# Altium footprint library Chip_Packaging.PcbLib: 101 footprints (part 2 of 7)
Each footprint in its own frame and in the unit in brackets; x right, y up, seen from the top. Pads: shape width x height; smd on the part's side, far side on the other; paste and mask are expansions set on the pad; w line width, h text height; cw(c..) or ccw(c..) is an arc to the next point about the centre after c.
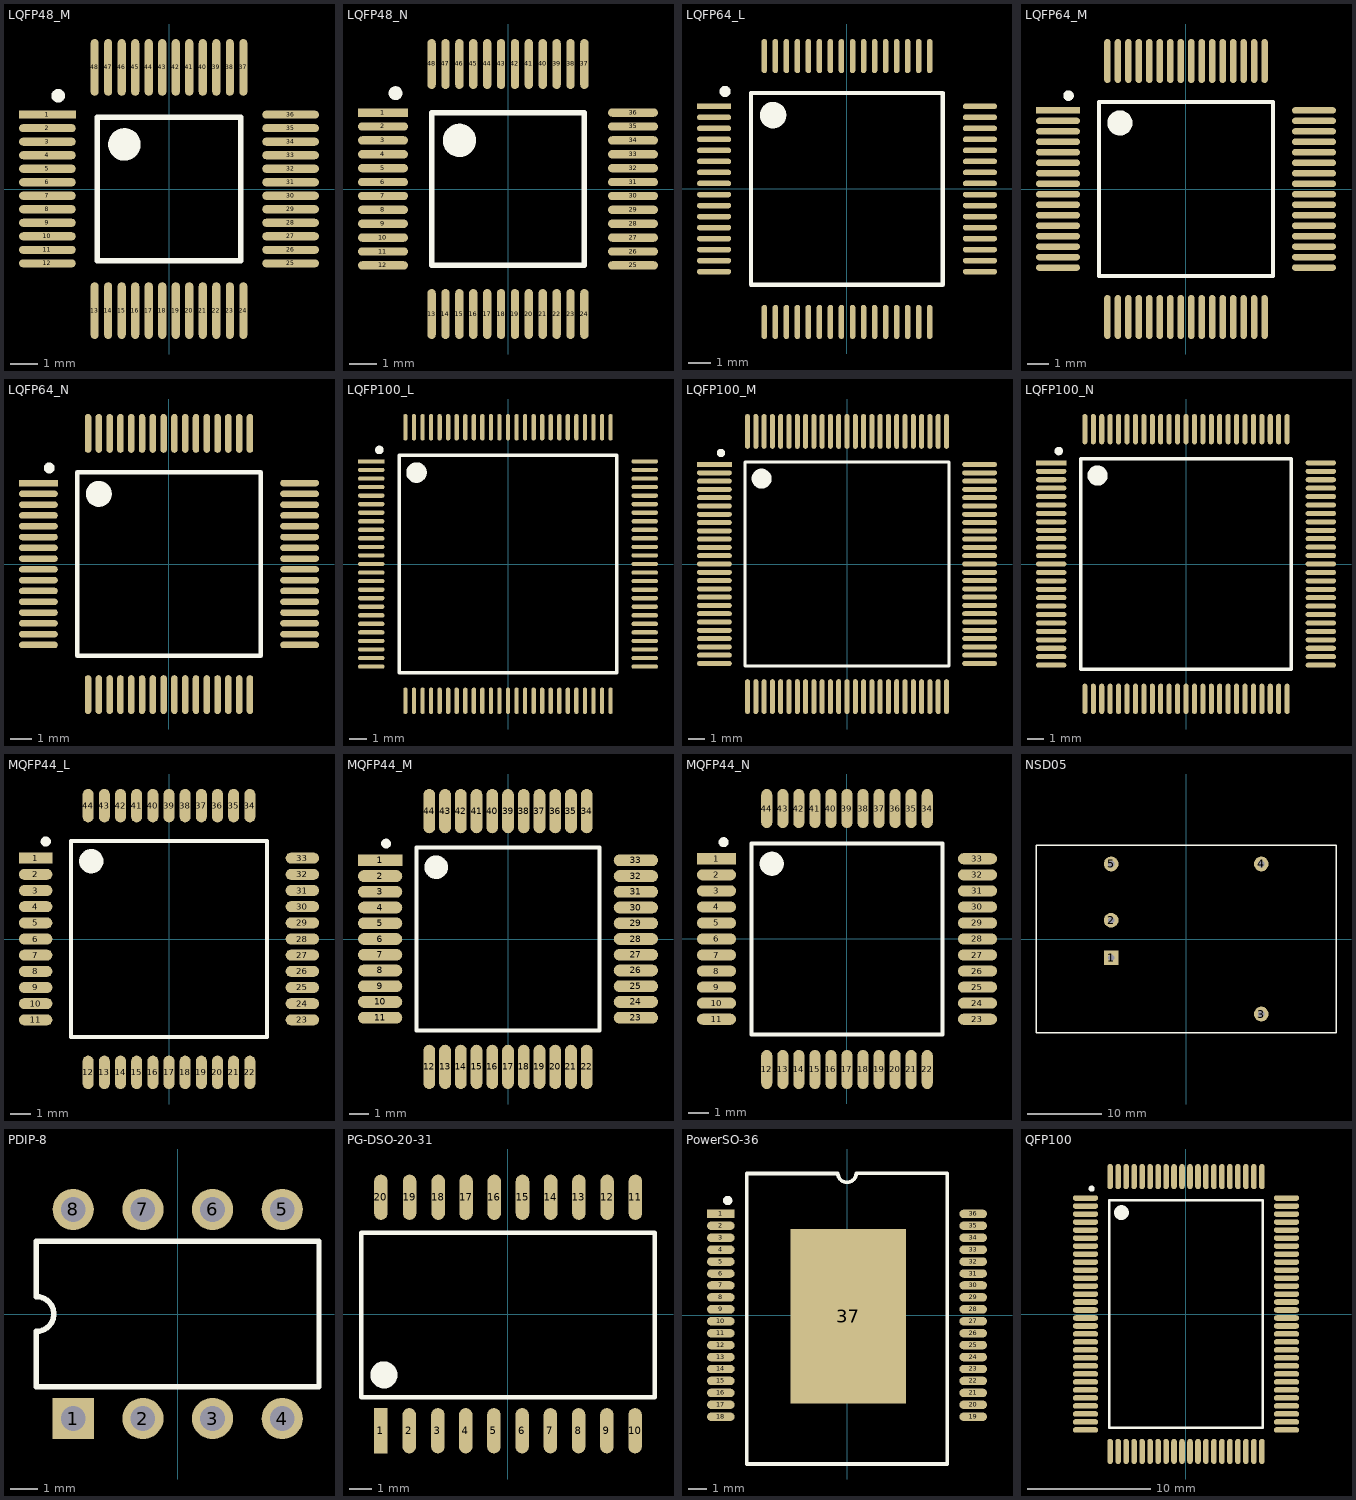
[diagram p1: the footprints below, top view; thin cyan lines are the x and y axes]

## LQFP48_M [mm] "Thin QFP, 48-Leads, Body 7x7mm, Pitch 0.5mm, IPC Low Density"
height 1.6
pads (48):
  rect 2.1x0.3 smd: 1(-4.5,2.75)
  oval 2.1x0.3 smd: 2(-4.5,2.25) 3(-4.5,1.75) 4(-4.5,1.25) 5(-4.5,0.75) 6(-4.5,0.25) 7(-4.5,-0.25) 8(-4.5,-0.75) 9(-4.5,-1.25) 10(-4.5,-1.75) 11(-4.5,-2.25) 12(-4.5,-2.75) 25(4.5,-2.75) 26(4.5,-2.25) 27(4.5,-1.75) 28(4.5,-1.25) 29(4.5,-0.75) 30(4.5,-0.25) 31(4.5,0.25) 32(4.5,0.75) 33(4.5,1.25) 34(4.5,1.75) 35(4.5,2.25) 36(4.5,2.75)
  oval 0.3x2.1 smd: 13(-2.75,-4.5) 14(-2.25,-4.5) 15(-1.75,-4.5) 16(-1.25,-4.5) 17(-0.75,-4.5) 18(-0.25,-4.5) 19(0.25,-4.5) 20(0.75,-4.5) 21(1.25,-4.5) 22(1.75,-4.5) 23(2.25,-4.5) 24(2.75,-4.5) 37(2.75,4.5) 38(2.25,4.5) 39(1.75,4.5) 40(1.25,4.5) 41(0.75,4.5) 42(0.25,4.5) 43(-0.25,4.5) 44(-0.75,4.5) 45(-1.25,4.5) 46(-1.75,4.5) 47(-2.25,4.5) 48(-2.75,4.5)
Top Overlay:
  circle w0.6: c-1.65,1.65 r0.3
  circle w0.25: c-4.1,3.45 r0.125
  lines w0.2: -2.65,-2.65 2.65,-2.65 2.65,2.65 -2.65,2.65 -2.65,-2.65
3D body "LQFP48.STEP": height 1.6, standoff 0, extent -4.5,-4.5 4.5,4.5

## LQFP48_N [mm] "Thin QFP, 48-Leads, Body 7x7mm, Pitch 0.5mm, IPC Medium Density"
height 1.6
pads (48):
  rect 1.8x0.3 smd: 1(-4.5,2.75)
  oval 1.8x0.3 smd: 2(-4.5,2.25) 3(-4.5,1.75) 4(-4.5,1.25) 5(-4.5,0.75) 6(-4.5,0.25) 7(-4.5,-0.25) 8(-4.5,-0.75) 9(-4.5,-1.25) 10(-4.5,-1.75) 11(-4.5,-2.25) 12(-4.5,-2.75) 25(4.5,-2.75) 26(4.5,-2.25) 27(4.5,-1.75) 28(4.5,-1.25) 29(4.5,-0.75) 30(4.5,-0.25) 31(4.5,0.25) 32(4.5,0.75) 33(4.5,1.25) 34(4.5,1.75) 35(4.5,2.25) 36(4.5,2.75)
  oval 0.3x1.8 smd: 13(-2.75,-4.5) 14(-2.25,-4.5) 15(-1.75,-4.5) 16(-1.25,-4.5) 17(-0.75,-4.5) 18(-0.25,-4.5) 19(0.25,-4.5) 20(0.75,-4.5) 21(1.25,-4.5) 22(1.75,-4.5) 23(2.25,-4.5) 24(2.75,-4.5) 37(2.75,4.5) 38(2.25,4.5) 39(1.75,4.5) 40(1.25,4.5) 41(0.75,4.5) 42(0.25,4.5) 43(-0.25,4.5) 44(-0.75,4.5) 45(-1.25,4.5) 46(-1.75,4.5) 47(-2.25,4.5) 48(-2.75,4.5)
Top Overlay:
  circle w0.25: c-4.05,3.45 r0.125
  circle w0.6: c-1.75,1.75 r0.3
  lines w0.2: -2.75,-2.75 -2.75,2.75 2.75,2.75 2.75,-2.75 -2.75,-2.75
3D body "LQFP48.STEP": height 1.6, standoff 0, extent -4.5,-4.5 4.5,4.5

## LQFP64_L [mm] "Thin QFP, 64-Leads, Body 10x10mm, Pitch 0.5mm, IPC High Density"
height 1.6
pads (64):
  rect 1.55x0.25 smd: 1(-6.025,3.75)
  oval 1.55x0.25 smd: 2(-6.025,3.25) 3(-6.025,2.75) 4(-6.025,2.25) 5(-6.025,1.75) 6(-6.025,1.25) 7(-6.025,0.75) 8(-6.025,0.25) 9(-6.025,-0.25) 10(-6.025,-0.75) 11(-6.025,-1.25) 12(-6.025,-1.75) 13(-6.025,-2.25) 14(-6.025,-2.75) 15(-6.025,-3.25) 16(-6.025,-3.75) 33(6.025,-3.75) 34(6.025,-3.25) 35(6.025,-2.75) 36(6.025,-2.25) 37(6.025,-1.75) 38(6.025,-1.25) 39(6.025,-0.75) 40(6.025,-0.25) 41(6.025,0.25) 42(6.025,0.75) 43(6.025,1.25) 44(6.025,1.75) 45(6.025,2.25) 46(6.025,2.75) 47(6.025,3.25) 48(6.025,3.75)
  oval 0.25x1.55 smd: 17(-3.75,-6.025) 18(-3.25,-6.025) 19(-2.75,-6.025) 20(-2.25,-6.025) 21(-1.75,-6.025) 22(-1.25,-6.025) 23(-0.75,-6.025) 24(-0.25,-6.025) 25(0.25,-6.025) 26(0.75,-6.025) 27(1.25,-6.025) 28(1.75,-6.025) 29(2.25,-6.025) 30(2.75,-6.025) 31(3.25,-6.025) 32(3.75,-6.025) 49(3.75,6.025) 50(3.25,6.025) 51(2.75,6.025) 52(2.25,6.025) 53(1.75,6.025) 54(1.25,6.025) 55(0.75,6.025) 56(0.25,6.025) 57(-0.25,6.025) 58(-0.75,6.025) 59(-1.25,6.025) 60(-1.75,6.025) 61(-2.25,6.025) 62(-2.75,6.025) 63(-3.25,6.025) 64(-3.75,6.025)
Top Overlay:
  circle w0.25: c-5.525,4.425 r0.125
  circle w0.6: c-3.35,3.35 r0.3
  lines w0.2: -4.35,-4.35 -4.35,4.35 4.35,4.35 4.35,-4.35 -4.35,-4.35
3D body "LQFP64.STEP": height 1.7, standoff -0.01, extent -6,-6 6,6

## LQFP64_M [mm] "Thin QFP, 64-Leads, Body 10x10mm, Pitch 0.5mm, IPC Low Density"
height 1.6
pads (64):
  rect 2.1x0.3 smd: 1(-6.1,3.75)
  oval 2.1x0.3 smd: 2(-6.1,3.25) 3(-6.1,2.75) 4(-6.1,2.25) 5(-6.1,1.75) 6(-6.1,1.25) 7(-6.1,0.75) 8(-6.1,0.25) 9(-6.1,-0.25) 10(-6.1,-0.75) 11(-6.1,-1.25) 12(-6.1,-1.75) 13(-6.1,-2.25) 14(-6.1,-2.75) 15(-6.1,-3.25) 16(-6.1,-3.75) 33(6.1,-3.75) 34(6.1,-3.25) 35(6.1,-2.75) 36(6.1,-2.25) 37(6.1,-1.75) 38(6.1,-1.25) 39(6.1,-0.75) 40(6.1,-0.25) 41(6.1,0.25) 42(6.1,0.75) 43(6.1,1.25) 44(6.1,1.75) 45(6.1,2.25) 46(6.1,2.75) 47(6.1,3.25) 48(6.1,3.75)
  oval 0.3x2.1 smd: 17(-3.75,-6.1) 18(-3.25,-6.1) 19(-2.75,-6.1) 20(-2.25,-6.1) 21(-1.75,-6.1) 22(-1.25,-6.1) 23(-0.75,-6.1) 24(-0.25,-6.1) 25(0.25,-6.1) 26(0.75,-6.1) 27(1.25,-6.1) 28(1.75,-6.1) 29(2.25,-6.1) 30(2.75,-6.1) 31(3.25,-6.1) 32(3.75,-6.1) 49(3.75,6.1) 50(3.25,6.1) 51(2.75,6.1) 52(2.25,6.1) 53(1.75,6.1) 54(1.25,6.1) 55(0.75,6.1) 56(0.25,6.1) 57(-0.25,6.1) 58(-0.75,6.1) 59(-1.25,6.1) 60(-1.75,6.1) 61(-2.25,6.1) 62(-2.75,6.1) 63(-3.25,6.1) 64(-3.75,6.1)
Top Overlay:
  circle w0.25: c-5.6,4.45 r0.125
  circle w0.6: c-3.15,3.15 r0.3
  lines w0.2: -4.15,-4.15 -4.15,4.15 4.15,4.15 4.15,-4.15 -4.15,-4.15
3D body "LQFP64.STEP": height 1.7, standoff -0.01, extent -6,-6 6,6

## LQFP64_N [mm] "Thin QFP, 64-Leads, Body 10x10mm, Pitch 0.5mm, IPC Medium Density"
height 1.6
pads (64):
  rect 1.8x0.3 smd: 1(-6.05,3.75)
  oval 1.8x0.3 smd: 2(-6.05,3.25) 3(-6.05,2.75) 4(-6.05,2.25) 5(-6.05,1.75) 6(-6.05,1.25) 7(-6.05,0.75) 8(-6.05,0.25) 9(-6.05,-0.25) 10(-6.05,-0.75) 11(-6.05,-1.25) 12(-6.05,-1.75) 13(-6.05,-2.25) 14(-6.05,-2.75) 15(-6.05,-3.25) 16(-6.05,-3.75) 33(6.05,-3.75) 34(6.05,-3.25) 35(6.05,-2.75) 36(6.05,-2.25) 37(6.05,-1.75) 38(6.05,-1.25) 39(6.05,-0.75) 40(6.05,-0.25) 41(6.05,0.25) 42(6.05,0.75) 43(6.05,1.25) 44(6.05,1.75) 45(6.05,2.25) 46(6.05,2.75) 47(6.05,3.25) 48(6.05,3.75)
  oval 0.3x1.8 smd: 17(-3.75,-6.05) 18(-3.25,-6.05) 19(-2.75,-6.05) 20(-2.25,-6.05) 21(-1.75,-6.05) 22(-1.25,-6.05) 23(-0.75,-6.05) 24(-0.25,-6.05) 25(0.25,-6.05) 26(0.75,-6.05) 27(1.25,-6.05) 28(1.75,-6.05) 29(2.25,-6.05) 30(2.75,-6.05) 31(3.25,-6.05) 32(3.75,-6.05) 49(3.75,6.05) 50(3.25,6.05) 51(2.75,6.05) 52(2.25,6.05) 53(1.75,6.05) 54(1.25,6.05) 55(0.75,6.05) 56(0.25,6.05) 57(-0.25,6.05) 58(-0.75,6.05) 59(-1.25,6.05) 60(-1.75,6.05) 61(-2.25,6.05) 62(-2.75,6.05) 63(-3.25,6.05) 64(-3.75,6.05)
Top Overlay:
  circle w0.25: c-5.55,4.45 r0.125
  circle w0.6: c-3.25,3.25 r0.3
  lines w0.2: -4.25,-4.25 -4.25,4.25 4.25,4.25 4.25,-4.25 -4.25,-4.25
3D body "LQFP64.STEP": height 1.7, standoff -0.01, extent -6,-6 6,6

## LQFP100_L [mm] "Thin QFP, 100-Leads, Body 14x14mm, Pitch 0.5mm, IPC High Density"
height 1.6
pads (100):
  rect 1.55x0.25 smd: 1(-8,6)
  oval 1.55x0.25 smd: 2(-8,5.5) 3(-8,5) 4(-8,4.5) 5(-8,4) 6(-8,3.5) 7(-8,3) 8(-8,2.5) 9(-8,2) 10(-8,1.5) 11(-8,1) 12(-8,0.5) 13(-8,0) 14(-8,-0.5) 15(-8,-1) 16(-8,-1.5) 17(-8,-2) 18(-8,-2.5) 19(-8,-3) 20(-8,-3.5) 21(-8,-4) 22(-8,-4.5) 23(-8,-5) 24(-8,-5.5) 25(-8,-6) 51(8,-6) 52(8,-5.5) 53(8,-5) 54(8,-4.5) 55(8,-4) 56(8,-3.5) 57(8,-3) 58(8,-2.5) 59(8,-2) 60(8,-1.5) 61(8,-1) 62(8,-0.5) 63(8,0) 64(8,0.5) 65(8,1) 66(8,1.5) 67(8,2) 68(8,2.5) 69(8,3) 70(8,3.5) 71(8,4) 72(8,4.5) 73(8,5) 74(8,5.5) 75(8,6)
  oval 0.25x1.55 smd: 26(-6,-8) 27(-5.5,-8) 28(-5,-8) 29(-4.5,-8) 30(-4,-8) 31(-3.5,-8) 32(-3,-8) 33(-2.5,-8) 34(-2,-8) 35(-1.5,-8) 36(-1,-8) 37(-0.5,-8) 38(0,-8) 39(0.5,-8) 40(1,-8) 41(1.5,-8) 42(2,-8) 43(2.5,-8) 44(3,-8) 45(3.5,-8) 46(4,-8) 47(4.5,-8) 48(5,-8) 49(5.5,-8) 50(6,-8) 76(6,8) 77(5.5,8) 78(5,8) 79(4.5,8) 80(4,8) 81(3.5,8) 82(3,8) 83(2.5,8) 84(2,8) 85(1.5,8) 86(1,8) 87(0.5,8) 88(0,8) 89(-0.5,8) 90(-1,8) 91(-1.5,8) 92(-2,8) 93(-2.5,8) 94(-3,8) 95(-3.5,8) 96(-4,8) 97(-4.5,8) 98(-5,8) 99(-5.5,8) 100(-6,8)
Top Overlay:
  circle w0.6: c-5.35,5.35 r0.3
  circle w0.25: c-7.525,6.675 r0.125
  lines w0.2: -6.35,-6.35 6.35,-6.35 6.35,6.35 -6.35,6.35 -6.35,-6.35
3D body "LQFP100.STEP": height 1.6, standoff 0, extent -8,-8 8,8

## LQFP100_M [mm] "Thin QFP, 100-Leads, Body 14x14mm, Pitch 0.5mm, IPC Low Density"
height 1.6
pads (100):
  rect 2.1x0.3 smd: 1(-8,6)
  oval 2.1x0.3 smd: 2(-8,5.5) 3(-8,5) 4(-8,4.5) 5(-8,4) 6(-8,3.5) 7(-8,3) 8(-8,2.5) 9(-8,2) 10(-8,1.5) 11(-8,1) 12(-8,0.5) 13(-8,0) 14(-8,-0.5) 15(-8,-1) 16(-8,-1.5) 17(-8,-2) 18(-8,-2.5) 19(-8,-3) 20(-8,-3.5) 21(-8,-4) 22(-8,-4.5) 23(-8,-5) 24(-8,-5.5) 25(-8,-6) 51(8,-6) 52(8,-5.5) 53(8,-5) 54(8,-4.5) 55(8,-4) 56(8,-3.5) 57(8,-3) 58(8,-2.5) 59(8,-2) 60(8,-1.5) 61(8,-1) 62(8,-0.5) 63(8,0) 64(8,0.5) 65(8,1) 66(8,1.5) 67(8,2) 68(8,2.5) 69(8,3) 70(8,3.5) 71(8,4) 72(8,4.5) 73(8,5) 74(8,5.5) 75(8,6)
  oval 0.3x2.1 smd: 26(-6,-8) 27(-5.5,-8) 28(-5,-8) 29(-4.5,-8) 30(-4,-8) 31(-3.5,-8) 32(-3,-8) 33(-2.5,-8) 34(-2,-8) 35(-1.5,-8) 36(-1,-8) 37(-0.5,-8) 38(0,-8) 39(0.5,-8) 40(1,-8) 41(1.5,-8) 42(2,-8) 43(2.5,-8) 44(3,-8) 45(3.5,-8) 46(4,-8) 47(4.5,-8) 48(5,-8) 49(5.5,-8) 50(6,-8) 76(6,8) 77(5.5,8) 78(5,8) 79(4.5,8) 80(4,8) 81(3.5,8) 82(3,8) 83(2.5,8) 84(2,8) 85(1.5,8) 86(1,8) 87(0.5,8) 88(0,8) 89(-0.5,8) 90(-1,8) 91(-1.5,8) 92(-2,8) 93(-2.5,8) 94(-3,8) 95(-3.5,8) 96(-4,8) 97(-4.5,8) 98(-5,8) 99(-5.5,8) 100(-6,8)
Top Overlay:
  circle w0.6: c-5.15,5.15 r0.3
  circle w0.25: c-7.6,6.7 r0.125
  lines w0.2: -6.15,-6.15 6.15,-6.15 6.15,6.15 -6.15,6.15 -6.15,-6.15
3D body "LQFP100.STEP": height 1.6, standoff 0, extent -8,-8 8,8

## LQFP100_N [mm] "Thin QFP, 100-Leads, Body 14x14mm, Pitch 0.5mm, IPC Medium Density"
height 1.6
pads (100):
  rect 1.8x0.3 smd: 1(-8,6)
  oval 1.8x0.3 smd: 2(-8,5.5) 3(-8,5) 4(-8,4.5) 5(-8,4) 6(-8,3.5) 7(-8,3) 8(-8,2.5) 9(-8,2) 10(-8,1.5) 11(-8,1) 12(-8,0.5) 13(-8,0) 14(-8,-0.5) 15(-8,-1) 16(-8,-1.5) 17(-8,-2) 18(-8,-2.5) 19(-8,-3) 20(-8,-3.5) 21(-8,-4) 22(-8,-4.5) 23(-8,-5) 24(-8,-5.5) 25(-8,-6) 51(8,-6) 52(8,-5.5) 53(8,-5) 54(8,-4.5) 55(8,-4) 56(8,-3.5) 57(8,-3) 58(8,-2.5) 59(8,-2) 60(8,-1.5) 61(8,-1) 62(8,-0.5) 63(8,0) 64(8,0.5) 65(8,1) 66(8,1.5) 67(8,2) 68(8,2.5) 69(8,3) 70(8,3.5) 71(8,4) 72(8,4.5) 73(8,5) 74(8,5.5) 75(8,6)
  oval 0.3x1.8 smd: 26(-6,-8) 27(-5.5,-8) 28(-5,-8) 29(-4.5,-8) 30(-4,-8) 31(-3.5,-8) 32(-3,-8) 33(-2.5,-8) 34(-2,-8) 35(-1.5,-8) 36(-1,-8) 37(-0.5,-8) 38(0,-8) 39(0.5,-8) 40(1,-8) 41(1.5,-8) 42(2,-8) 43(2.5,-8) 44(3,-8) 45(3.5,-8) 46(4,-8) 47(4.5,-8) 48(5,-8) 49(5.5,-8) 50(6,-8) 76(6,8) 77(5.5,8) 78(5,8) 79(4.5,8) 80(4,8) 81(3.5,8) 82(3,8) 83(2.5,8) 84(2,8) 85(1.5,8) 86(1,8) 87(0.5,8) 88(0,8) 89(-0.5,8) 90(-1,8) 91(-1.5,8) 92(-2,8) 93(-2.5,8) 94(-3,8) 95(-3.5,8) 96(-4,8) 97(-4.5,8) 98(-5,8) 99(-5.5,8) 100(-6,8)
Top Overlay:
  circle w0.25: c-7.55,6.7 r0.125
  circle w0.6: c-5.25,5.25 r0.3
  lines w0.2: -6.25,-6.25 -6.25,6.25 6.25,6.25 6.25,-6.25 -6.25,-6.25
3D body "LQFP100.STEP": height 1.6, standoff 0, extent -8,-8 8,8

## MQFP44_L [mm] "QFP, 44-Leads, Body 10x10mm, Pitch 0.8mm, IPC High Density"
height 2.39
pads (44):
  rect 1.65x0.55 smd: 1(-6.6,4)
  oval 1.65x0.55 smd: 2(-6.6,3.2) 3(-6.6,2.4) 4(-6.6,1.6) 5(-6.6,0.8) 6(-6.6,0) 7(-6.6,-0.8) 8(-6.6,-1.6) 9(-6.6,-2.4) 10(-6.6,-3.2) 11(-6.6,-4) 23(6.6,-4) 24(6.6,-3.2) 25(6.6,-2.4) 26(6.6,-1.6) 27(6.6,-0.8) 28(6.6,0) 29(6.6,0.8) 30(6.6,1.6) 31(6.6,2.4) 32(6.6,3.2) 33(6.6,4)
  oval 0.55x1.65 smd: 12(-4,-6.6) 13(-3.2,-6.6) 14(-2.4,-6.6) 15(-1.6,-6.6) 16(-0.8,-6.6) 17(0,-6.6) 18(0.8,-6.6) 19(1.6,-6.6) 20(2.4,-6.6) 21(3.2,-6.6) 22(4,-6.6) 34(4,6.6) 35(3.2,6.6) 36(2.4,6.6) 37(1.6,6.6) 38(0.8,6.6) 39(0,6.6) 40(-0.8,6.6) 41(-1.6,6.6) 42(-2.4,6.6) 43(-3.2,6.6) 44(-4,6.6)
Top Overlay:
  circle w0.25: c-6.1,4.825 r0.125
  circle w0.6: c-3.85,3.85 r0.3
  lines w0.2: -4.85,-4.85 -4.85,4.85 4.85,4.85 4.85,-4.85 -4.85,-4.85
3D body "MQFP44.STEP": height 2.25, standoff 0, extent -6.6,-6.6 6.6,6.6

## MQFP44_M [mm] "QFP, 44-Leads, Body 10x10mm, Pitch 0.8mm, IPC Low Density"
height 2.39
pads (44):
  rect 2.25x0.6 smd: 1(-6.5,4)
  oval 2.25x0.6 smd: 2(-6.5,3.2) 3(-6.5,2.4) 4(-6.5,1.6) 5(-6.5,0.8) 6(-6.5,0) 7(-6.5,-0.8) 8(-6.5,-1.6) 9(-6.5,-2.4) 10(-6.5,-3.2) 11(-6.5,-4) 23(6.5,-4) 24(6.5,-3.2) 25(6.5,-2.4) 26(6.5,-1.6) 27(6.5,-0.8) 28(6.5,0) 29(6.5,0.8) 30(6.5,1.6) 31(6.5,2.4) 32(6.5,3.2) 33(6.5,4)
  oval 0.6x2.25 smd: 12(-4,-6.5) 13(-3.2,-6.5) 14(-2.4,-6.5) 15(-1.6,-6.5) 16(-0.8,-6.5) 17(0,-6.5) 18(0.8,-6.5) 19(1.6,-6.5) 20(2.4,-6.5) 21(3.2,-6.5) 22(4,-6.5) 34(4,6.5) 35(3.2,6.5) 36(2.4,6.5) 37(1.6,6.5) 38(0.8,6.5) 39(0,6.5) 40(-0.8,6.5) 41(-1.6,6.5) 42(-2.4,6.5) 43(-3.2,6.5) 44(-4,6.5)
Top Overlay:
  circle w0.25: c-6.2,4.85 r0.125
  circle w0.6: c-3.65,3.65 r0.3
  lines w0.2: -4.65,-4.65 -4.65,4.65 4.65,4.65 4.65,-4.65 -4.65,-4.65
3D body "MQFP44.STEP": height 2.25, standoff 0, extent -6.6,-6.6 6.6,6.6

## MQFP44_N [mm] "QFP, 44-Leads, Body 10x10mm, Pitch 0.8mm, IPC Medium Density"
height 2.39
pads (44):
  rect 1.95x0.55 smd: 1(-6.5,4)
  oval 1.95x0.55 smd: 2(-6.5,3.2) 3(-6.5,2.4) 4(-6.5,1.6) 5(-6.5,0.8) 6(-6.5,0) 7(-6.5,-0.8) 8(-6.5,-1.6) 9(-6.5,-2.4) 10(-6.5,-3.2) 11(-6.5,-4) 23(6.5,-4) 24(6.5,-3.2) 25(6.5,-2.4) 26(6.5,-1.6) 27(6.5,-0.8) 28(6.5,0) 29(6.5,0.8) 30(6.5,1.6) 31(6.5,2.4) 32(6.5,3.2) 33(6.5,4)
  oval 0.55x1.95 smd: 12(-4,-6.5) 13(-3.2,-6.5) 14(-2.4,-6.5) 15(-1.6,-6.5) 16(-0.8,-6.5) 17(0,-6.5) 18(0.8,-6.5) 19(1.6,-6.5) 20(2.4,-6.5) 21(3.2,-6.5) 22(4,-6.5) 34(4,6.5) 35(3.2,6.5) 36(2.4,6.5) 37(1.6,6.5) 38(0.8,6.5) 39(0,6.5) 40(-0.8,6.5) 41(-1.6,6.5) 42(-2.4,6.5) 43(-3.2,6.5) 44(-4,6.5)
Top Overlay:
  circle w0.6: c-3.75,3.75 r0.3
  circle w0.25: c-6.15,4.825 r0.125
  lines w0.2: -4.75,-4.75 4.75,-4.75 4.75,4.75 -4.75,4.75 -4.75,-4.75
3D body "MQFP44.STEP": height 2.25, standoff 0, extent -6.6,-6.6 6.6,6.6

## NSD05 [mm] "5W DC-DC Regulated Single Output"
height 8.3
pads (5):
  rect 2x2 hole 0.9: 1(-10.16,-2.54)
  round 2 hole 0.9: 2(-10.16,2.54) 3(10.16,-10.16) 4(10.16,10.16) 5(-10.16,10.16)
Top Overlay:
  lines w0.2: -19.33,-12.7 -18.33,-12.7 ; -20.33,-12.7 -20.33,12.7 20.27,12.7 20.27,-12.7 -20.33,-12.7
3D body: height 8.3, standoff 2.3, extent -17.5,-11 17.5,11
3D body: height 2.3, standoff 1.5, extent -20.325,-12.7 20.275,12.675
3D body: height 0, standoff -3, extent 9.84,9.84 10.48,10.48
3D body: height 1.5, standoff 0, extent 9.52,9.52 10.8,10.8
3D body: height 0, standoff -3, extent 9.84,-10.48 10.48,-9.84
3D body: height 1.5, standoff 0, extent 9.52,-10.8 10.8,-9.52
3D body: height 0, standoff -3, extent -10.48,-2.86 -9.84,-2.22
3D body: height 1.5, standoff 0, extent -10.8,-3.18 -9.52,-1.9
3D body: height 0, standoff -3, extent -10.48,2.22 -9.84,2.86
3D body: height 1.5, standoff 0, extent -10.8,1.9 -9.52,3.18
3D body: height 1.5, standoff 0, extent -10.8,9.52 -9.52,10.8
3D body: height 0, standoff -3, extent -10.48,9.84 -9.84,10.48

## PDIP-8 [mm] "DIP; 8 Leads; Row Spacing 7.62 mm; Pitch 2.54 mm"
height 4.45
pads (8):
  rect 1.5x1.5 hole 0.9: 1(-3.81,-3.81)
  round 1.5 hole 0.9: 2(-1.27,-3.81) 3(1.27,-3.81) 4(3.81,-3.81) 5(3.81,3.81) 6(1.27,3.81) 7(-1.27,3.81) 8(-3.81,3.81)
Top Overlay:
  lines w0.2: -5.15,-2.65 -5.15,-0.635 ccw(c-5.15,0) -5.15,0.635 -5.15,2.65 5.15,2.65 5.15,-2.65 -5.15,-2.65
3D body "DIP-8.STEP": height 4.57, standoff -3.81, extent -4.955,-3.91 4.955,3.91

## PG-DSO-20-31 [mm]
height 2.65
pads (20):
  rect 0.6x2 smd: 1(-5.642,-5.17)
  oval 0.6x2 smd: 2(-4.372,-5.17) 3(-3.102,-5.17) 4(-1.872,-5.17) 5(-0.622,-5.17) 6(0.628,-5.17) 7(1.878,-5.17) 8(3.128,-5.17) 9(4.378,-5.17) 10(5.628,-5.17) 11(5.643,5.17) 12(4.393,5.17) 13(3.143,5.17) 14(1.893,5.17) 15(0.643,5.17) 16(-0.607,5.17) 17(-1.857,5.17) 18(-3.087,5.17) 19(-4.357,5.17) 20(-5.627,5.17)
Top Overlay:
  circle w0.6: c-5.492,-2.695 r0.3
  lines w0.2: -6.492,-3.695 6.508,-3.695 6.508,3.6 -6.492,3.6 -6.492,-3.695
3D body "SOIC-20.STEP": height 2.66, standoff 0, extent -6.5,-5.315 6.5,5.315

## PowerSO-36 [mm]
pads (37):
  rect 1.5x0.46 smd: 1(-6.875,5.525)
  oval 1.5x0.46 smd: 2(-6.875,4.875) 3(-6.875,4.225) 4(-6.875,3.575) 5(-6.875,2.925) 6(-6.875,2.275) 7(-6.875,1.625) 8(-6.875,0.975) 9(-6.875,0.325) 10(-6.875,-0.325) 11(-6.875,-0.975) 12(-6.875,-1.625) 13(-6.875,-2.275) 14(-6.875,-2.925) 15(-6.875,-3.575) 16(-6.875,-4.225) 17(-6.875,-4.875) 18(-6.875,-5.525) 19(6.875,-5.525) 20(6.875,-4.875) 21(6.875,-4.225) 22(6.875,-3.575) 23(6.875,-2.925) 24(6.875,-2.275) 25(6.875,-1.625) 26(6.875,-0.975) 27(6.875,-0.325) 28(6.875,0.325) 29(6.875,0.975) 30(6.875,1.625) 31(6.875,2.275) 32(6.875,2.925) 33(6.875,3.575) 34(6.875,4.225) 35(6.875,4.875) 36(6.875,5.525)
  rect 6.3x9.5 smd: 37(0.075,-0.06)
Top Overlay:
  circle w0.3: c-6.5,6.25 r0.1
  lines w0.2: -0.5,7.725 -5.465,7.725 -5.465,-8.1 5.465,-8.1 5.465,7.732 0.5,7.732 cw(c0,7.741) -0.5,7.725
3D body "SO-36.STEP": height 3.6, standoff 0.1, extent -7.1,-8.125 7.1,7.825

## QFP100 [mm] "QFP, 100-Leads, Body 20x14mm, Pitch 0.65mm, IPC Low Density"
height 1.6
pads (100):
  oval 2.05x0.45 smd: 1(-8.175,9.425) 2(-8.175,8.775) 3(-8.175,8.125) 4(-8.175,7.475) 5(-8.175,6.825) 6(-8.175,6.175) 7(-8.175,5.525) 8(-8.175,4.875) 9(-8.175,4.225) 10(-8.175,3.575) 11(-8.175,2.925) 12(-8.175,2.275) 13(-8.175,1.625) 14(-8.175,0.975) 15(-8.175,0.325) 16(-8.175,-0.325) 17(-8.175,-0.975) 18(-8.175,-1.625) 19(-8.175,-2.275) 20(-8.175,-2.925) 21(-8.175,-3.575) 22(-8.175,-4.225) 23(-8.175,-4.875) 24(-8.175,-5.525) 25(-8.175,-6.175) 26(-8.175,-6.825) 27(-8.175,-7.475) 28(-8.175,-8.125) 29(-8.175,-8.775) 30(-8.175,-9.425) 51(8.175,-9.425) 52(8.175,-8.775) 53(8.175,-8.125) 54(8.175,-7.475) 55(8.175,-6.825) 56(8.175,-6.175) 57(8.175,-5.525) 58(8.175,-4.875) 59(8.175,-4.225) 60(8.175,-3.575) 61(8.175,-2.925) 62(8.175,-2.275) 63(8.175,-1.625) 64(8.175,-0.975) 65(8.175,-0.325) 66(8.175,0.325) 67(8.175,0.975) 68(8.175,1.625) 69(8.175,2.275) 70(8.175,2.925) 71(8.175,3.575) 72(8.175,4.225) 73(8.175,4.875) 74(8.175,5.525) 75(8.175,6.175) 76(8.175,6.825) 77(8.175,7.475) 78(8.175,8.125) 79(8.175,8.775) 80(8.175,9.425)
  oval 0.45x2.05 smd: 31(-6.175,-11.175) 32(-5.525,-11.175) 33(-4.875,-11.175) 34(-4.225,-11.175) 35(-3.575,-11.175) 36(-2.925,-11.175) 37(-2.275,-11.175) 38(-1.625,-11.175) 39(-0.975,-11.175) 40(-0.325,-11.175) 41(0.325,-11.175) 42(0.975,-11.175) 43(1.625,-11.175) 44(2.275,-11.175) 45(2.925,-11.175) 46(3.575,-11.175) 47(4.225,-11.175) 48(4.875,-11.175) 49(5.525,-11.175) 50(6.175,-11.175) 81(6.175,11.175) 82(5.525,11.175) 83(4.875,11.175) 84(4.225,11.175) 85(3.575,11.175) 86(2.925,11.175) 87(2.275,11.175) 88(1.625,11.175) 89(0.975,11.175) 90(0.325,11.175) 91(-0.325,11.175) 92(-0.975,11.175) 93(-1.625,11.175) 94(-2.275,11.175) 95(-2.925,11.175) 96(-3.575,11.175) 97(-4.225,11.175) 98(-4.875,11.175) 99(-5.525,11.175) 100(-6.175,11.175)
Top Overlay:
  circle w0.6: c-5.25,8.25 r0.3
  circle w0.25: c-7.675,10.2 r0.125
  lines w0.2: -6.25,-9.25 6.25,-9.25 6.25,9.25 -6.25,9.25 -6.25,-9.25
3D body "QFP100.STEP": height 3.4, standoff 0, extent -8.95,-11.95 8.95,11.95